# Altium footprint library Footprints.PcbLib: 158 footprints (part 4 of 10)
Each footprint in its own frame and in the unit in brackets; x right, y up, seen from the top. Pads: shape width x height; smd on the part's side, far side on the other; paste and mask are expansions set on the pad; w line width, h text height; cw(c..) or ccw(c..) is an arc to the next point about the centre after c.
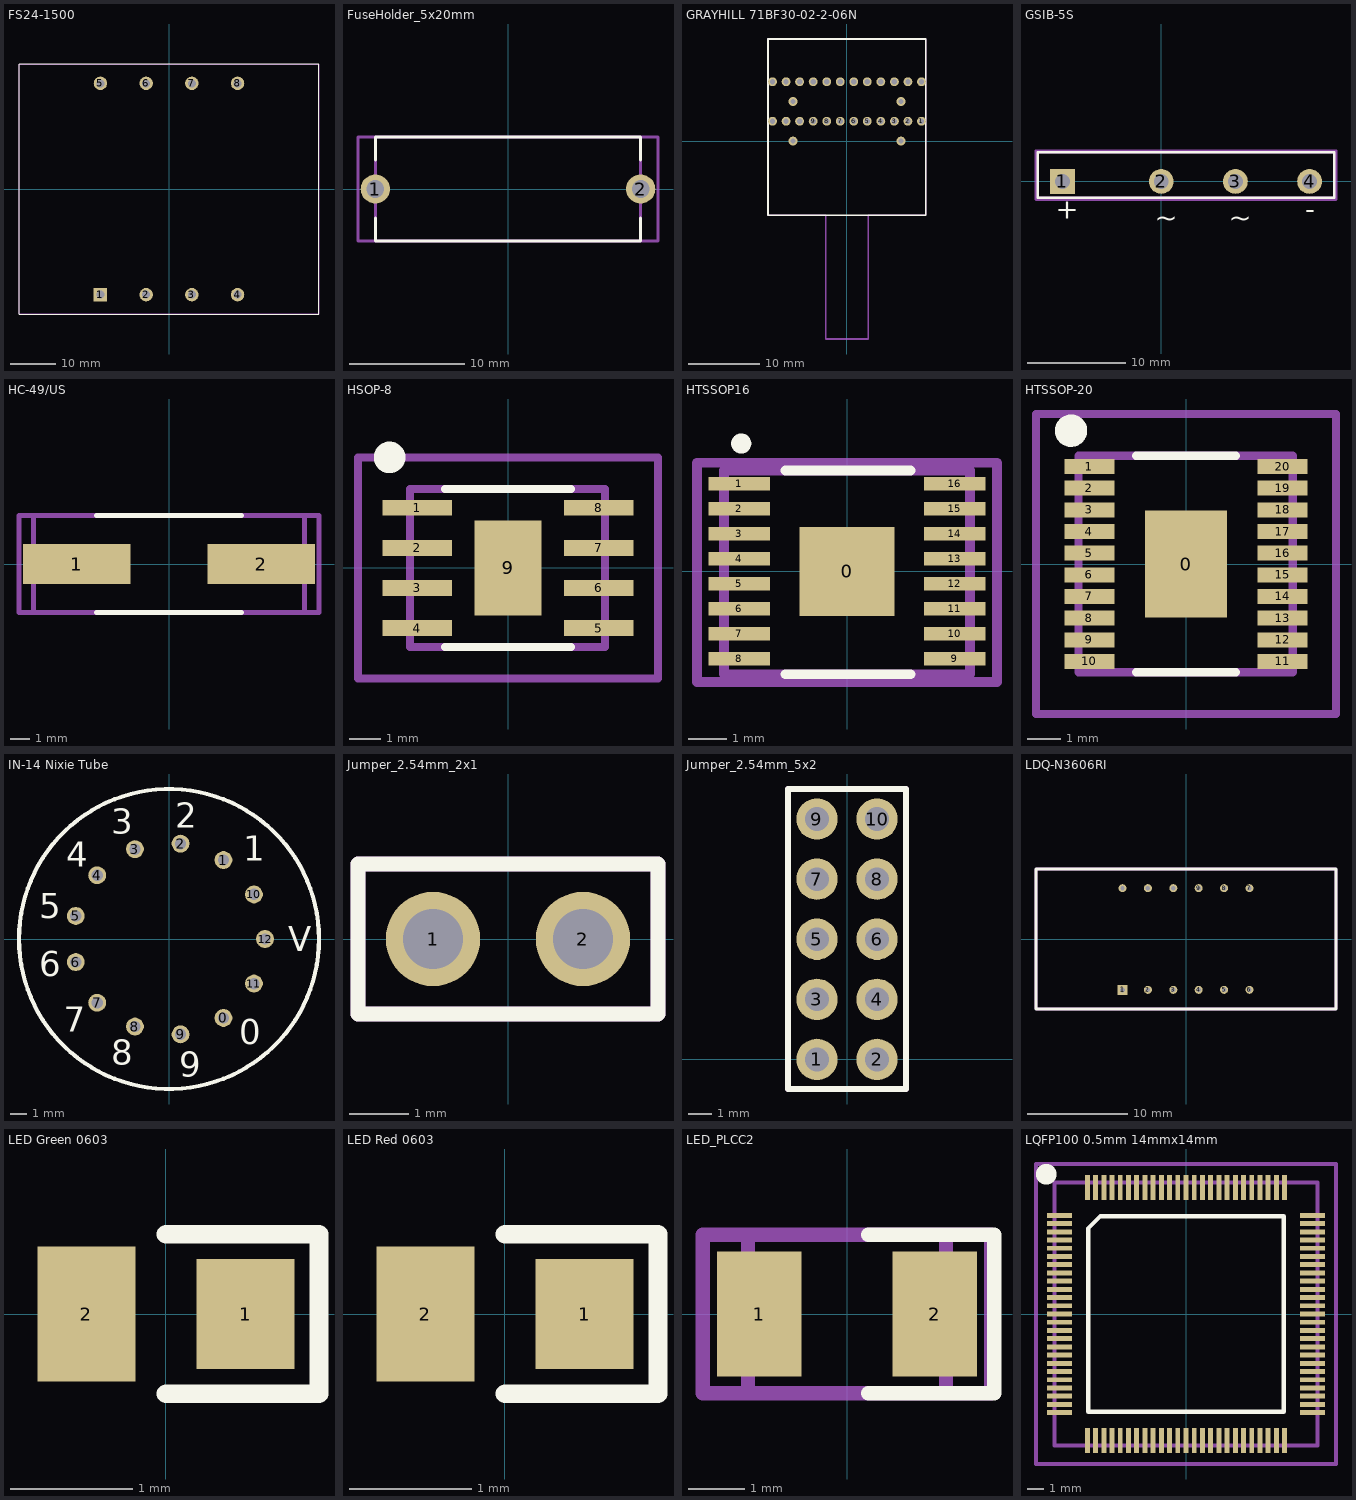
[diagram p3: the footprints below, top view; thin cyan lines are the x and y axes]

## FS24-1500 [mm] "115:115 - 24:24 xfrmr"
height 39.776
pads (8):
  rect 3x3 hole 1.8 mask+0.102: 1(-15.24,-23.5)
  round 3 hole 1.8 mask+0.102: 2(-5.08,-23.5) 3(5.08,-23.5) 4(15.24,-23.5) 5(-15.24,23.5) 6(-5.08,23.5) 7(5.08,23.5) 8(15.24,23.5)
Top Overlay:
  lines w0.254: -33.35,27.775 -33.35,-27.8 33.35,-27.8 33.35,27.8 -33.35,27.8
Mechanical 13:
  lines w0.254: -33.35,-27.788 -33.35,27.788 33.35,27.788 33.35,-27.788 -33.35,-27.788
3D body: height 39.67, standoff 0, extent -17.5,-23.5 17.5,23.5
3D body: height 25.4, standoff 12.7, extent -33.325,-27.825 33.325,27.8
3D body: height 2, standoff -4, extent -16.273,22.461 -14.198,24.539
3D body: height 2, standoff -4, extent -6.113,22.461 -4.038,24.539
3D body: height 2, standoff -4, extent 4.047,22.461 6.122,24.539
3D body: height 2, standoff -4, extent 14.207,22.461 16.282,24.539
3D body: height 2, standoff -4, extent -16.273,-24.539 -14.198,-22.461
3D body: height 2, standoff -4, extent -6.113,-24.539 -4.038,-22.461
3D body: height 2, standoff -4, extent 4.047,-24.539 6.122,-22.461
3D body: height 2, standoff -4, extent 14.207,-24.539 16.282,-22.461

## FuseHolder_5x20mm [mm]
height 12.7
pads (2):
  round 2.54 hole 1.524 mask+0.102: 1(-11.5,0) 2(11.5,0)
Top Overlay:
  lines w0.254: -11.5,-2.5 -11.5,-4.5 11.5,-4.5 11.5,-2.5 ; -11.5,2.5 -11.5,4.5 11.5,4.5 11.5,2.5
Mechanical 13:
  lines w0.254: -11.5,-4.5 11.5,-4.5 11.5,4.5 -11.5,4.5 -11.5,-4.5
Mechanical 15:
  lines w0.254: -13,-4.5 13,-4.5 13,4.5 -13,4.5 -13,-4.5
3D body: height 13.44, standoff -5.4, extent -11.64,-4.5 11.52,4.5

## GRAYHILL 71BF30-02-2-06N [mm] "Two deck, DP6T Rotary Switch"
height 16.5
pads (28):
  round 1.25 hole 0.75 mask+0.102: 1(10.51,2.79) 2(8.6,2.79) 3(6.69,2.79) 4(4.78,2.79) 5(2.87,2.79) 6(0.96,2.79) 7(-0.95,2.79) 8(-2.86,2.79) 9(-4.77,2.79) 10(-6.68,2.79) 11(-8.59,2.79) 12(-10.5,2.79) 13(10.51,8.37) 14(8.6,8.37) 15(6.69,8.37) 16(4.78,8.37) 17(2.87,8.37) 18(0.96,8.37) 19(-0.95,8.37) 20(-2.86,8.37) 21(-4.77,8.37) 22(-6.68,8.37) 23(-8.59,8.37) 24(-10.5,8.37) 25(7.625,0) 26(7.625,5.58) 27(-7.615,0) 28(-7.615,5.58)
Top Overlay:
  lines w0.254: -11.125,-10.475 3,-10.475 11.125,-10.475 11.125,14.4 -11.125,14.4 -11.125,-10.475
Mechanical 13:
  lines w0.254: -3.025,-10.475 -11.125,-10.475 -11.125,14.4 11.125,14.4 11.125,-10.475 3,-10.475 3,-27.925 -3,-27.925 -3,-10.475
Mechanical 15:
  lines w0.254: -11.125,-10.475 -3,-10.475 -3,-27.925 3,-27.925 3,-10.475 11.125,-10.475 11.125,14.4 -11.125,14.4 -11.125,-10.475
3D body: height 16.5, standoff 0, extent -11.125,-27.925 11.15,14.425

## GSIB-5S [mm] "Bridge Rectifier"
height 20
pads (4):
  rect 2.5x2.5 hole 1.5 mask+0.102: 1(-10,0)
  round 2.5 hole 1.5 mask+0.102: 2(0,0) 3(7.5,0) 4(15,0)
Top Overlay:
  lines w0.254: -12.5,-1.65 17.5,-1.65 17.5,2.95 -12.5,2.95 -12.5,-1.65
  text "+" at -10.675,-3.775 h2.03
  text "-" at 14.575,-3.775 h2.03
  text "~" at -0.675,-4.65 h2.03
  text "~" at 6.825,-4.65 h2.03
Mechanical 13:
  lines w0.254: -12.5,-1.65 -12.5,2.95 17.5,2.95 17.5,-1.65 -12.5,-1.65
Mechanical 15:
  lines w0.254: -12.675,-1.825 -12.675,3.125 17.675,3.125 17.675,-1.825 -12.675,-1.825
3D body: height 1, standoff -4, extent 7.004,-0.499 8,0.499
3D body: height 1, standoff -4, extent 14.504,-0.499 15.5,0.499
3D body: height 1, standoff -4, extent -0.496,-0.499 0.5,0.499
3D body: height 1, standoff -4, extent -10.496,-0.499 -9.5,0.499
3D body: height 20, standoff 1, extent -12.5,-1.65 17.5,2.95

## HC-49/US [mm] "Crystal"
height 4.5
pads (2):
  rect 5.55x2.05 smd mask+0.102: 1(-4.775,0) 2(4.775,0)
Top Overlay:
  lines w0.254: -3.75,-2.5 3.75,-2.5 ; -3.75,2.5 3.75,2.5
Mechanical 13:
  lines w0.254: -7,-2.5 -7,2.5 7,2.5 7,-2.5 -7,-2.5
Mechanical 15:
  lines w0.254: -7.75,-2.5 -7.75,2.5 7.75,2.5 7.75,-2.5 -7.75,-2.5
3D body: height 4.5, standoff -0.01, extent -6.95,-2.5 6.95,2.5

## HSOP-8 [mm]
height 1.7
pads (9):
  rect 2.2x0.5 smd: 1(-2.875,1.905) 2(-2.875,0.635) 3(-2.875,-0.635) 4(-2.875,-1.905) 5(2.875,-1.905) 6(2.875,-0.635) 7(2.875,0.635) 8(2.875,1.905)
  rect 2.13x3 smd paste-0.35: 9(0,0)
Top Overlay:
  circle w0.5: c-3.75,3.5 r0.25
  lines w0.254: -2,-2.5 2,-2.5 ; -2,2.5 2,2.5
Mechanical 13:
  lines w0.254: -3.1,-2.5 -3.1,2.5 3.075,2.5 3.075,-2.5 -3.1,-2.5
Mechanical 15:
  lines w0.254: -4.75,-3.5 4.75,-3.5 4.75,3.5 -4.75,3.5 -4.75,-3.5
3D body: height 2, standoff 0, extent -3.081,-2.5 3.082,2.5

## HTSSOP16 [mm] "0.65mm Pitch"
height 1.2
pads (17):
  rect 2.46x2.31 smd mask+0.102: 0(0,0)
  rect 1.6x0.35 smd mask+0.102: 1(-2.8,2.275) 2(-2.8,1.625) 3(-2.8,0.975) 4(-2.8,0.325) 5(-2.8,-0.325) 6(-2.8,-0.975) 7(-2.8,-1.625) 8(-2.8,-2.275) 9(2.8,-2.275) 10(2.8,-1.625) 11(2.8,-0.975) 12(2.8,-0.325) 13(2.8,0.325) 14(2.8,0.975) 15(2.8,1.625) 16(2.8,2.275)
Top Overlay:
  circle w0.254: c-2.75,3.325 r0.135
  lines w0.254: -1.6,-2.675 1.65,-2.675 ; -1.6,2.625 1.65,2.625
Mechanical 13:
  lines w0.254: -3.2,-2.675 3.2,-2.675 3.2,2.625 -3.2,2.625 -3.2,-2.675
Mechanical 15:
  lines w0.254: -3.9,-2.875 3.9,-2.875 3.9,2.825 -3.9,2.825 -3.9,-2.875
3D body: height 1.09, standoff 0, extent -3.058,-2.5 3.222,2.5

## HTSSOP-20 [mm]
height 1.2
pads (21):
  rect 2.45x3.2 smd: 0(0,0)
  rect 1.5x0.45 smd: 1(-2.9,2.925) 2(-2.9,2.275) 3(-2.9,1.625) 4(-2.9,0.975) 5(-2.9,0.325) 6(-2.9,-0.325) 7(-2.9,-0.975) 8(-2.9,-1.625) 9(-2.9,-2.275) 10(-2.9,-2.925) 11(2.9,-2.925) 12(2.9,-2.275) 13(2.9,-1.625) 14(2.9,-0.975) 15(2.9,-0.325) 16(2.9,0.325) 17(2.9,0.975) 18(2.9,1.625) 19(2.9,2.275) 20(2.9,2.925)
Top Overlay:
  circle w0.5: c-3.45,4 r0.237
  lines w0.254: -1.5,-3.25 1.5,-3.25 ; -1.5,3.25 1.5,3.25
Mechanical 13:
  lines w0.254: -3.225,-3.25 -3.225,3.25 3.2,3.25 3.2,-3.25 -3.225,-3.25
Mechanical 15:
  lines w0.254: -4.5,-4.5 4.5,-4.5 4.5,4.5 -4.5,4.5 -4.5,-4.5
3D body: height 0.95, standoff -0.06, extent -3.232,-3.25 3.182,3.25

## IN-14 Nixie Tube [mm]
pads (13):
  round 1.1 hole 0.7: 0(3.36,-4.87) 1(3.36,4.87) 2(0.71,5.88) 3(-2.1,5.54) 4(-4.43,3.93) 5(-5.75,1.42) 6(-5.75,-1.42) 7(-4.43,-3.93) 8(-2.1,-5.4) 9(0.71,-5.88) 10(5.24,2.75) 11(5.24,-2.75) 12(5.92,0)
Top Overlay:
  circle w0.254: c0,0 r9.25
  text "V" at 7.366,-0.762 h1.52
  text "0" at 4.318,-6.477 h1.52
  text "1" at 4.572,4.826 h1.52
  text "2" at 0.381,6.858 h1.52
  text "3" at -3.556,6.477 h1.52
  text "8" at -3.556,-7.747 h1.52
  text "6" at -8.001,-2.286 h1.52
  text "5" at -8.001,1.27 h1.52
  text "4" at -6.35,4.445 h1.52
  text "9" at 0.635,-8.509 h1.52
  text "7" at -6.477,-5.715 h1.52
3D body: height 2, standoff -3, extent 3.112,4.621 3.61,5.12
3D body: height 2, standoff -3, extent 0.462,5.631 0.96,6.13
3D body: height 2, standoff -3, extent -2.348,5.291 -1.85,5.79
3D body: height 2, standoff -3, extent -4.678,3.681 -4.18,4.18
3D body: height 2, standoff -3, extent -5.998,1.171 -5.5,1.67
3D body: height 2, standoff -3, extent -5.998,-1.669 -5.5,-1.17
3D body: height 2, standoff -3, extent -4.678,-4.179 -4.18,-3.68
3D body: height 2, standoff -3, extent -2.348,-5.649 -1.85,-5.15
3D body: height 2, standoff -3, extent 0.462,-6.129 0.96,-5.63
3D body: height 2, standoff -3, extent 3.112,-5.119 3.61,-4.62
3D body: height 2, standoff -3, extent 4.992,-2.999 5.49,-2.5
3D body: height 2, standoff -3, extent 5.672,-0.249 6.17,0.25
3D body: height 2, standoff -3, extent 4.992,2.501 5.49,3
3D body: height 40.5, standoff 2, extent -8.433,-8.483 8.5,8.483

## Jumper_2.54mm_2x1 [mm]
height 8.51
pads (2):
  round 1.6 hole 1.02 mask+0.102: 1(-1.27,0) 2(1.27,0)
Top Overlay:
  lines w0.254: -2.54,-1.27 2.54,-1.27 2.54,1.27 -2.54,1.27 -2.54,-1.27
Mechanical 13:
  lines w0.254: -2.54,-1.27 2.54,-1.27 2.54,1.27 -2.54,1.27 -2.54,-1.27
Mechanical 15:
  lines w0.254: -2.54,-1.27 2.54,-1.27 2.54,1.27 -2.54,1.27 -2.54,-1.27
3D body: height 18.66, standoff -3.7, extent -2.54,-1.27 2.54,1.27

## Jumper_2.54mm_5x2 [mm]
height 7.54
pads (10):
  round 1.75 hole 1 mask+0.102: 1(-1.27,0) 2(1.27,0) 3(-1.27,2.54) 4(1.27,2.54) 5(-1.27,5.08) 6(1.27,5.08) 7(-1.27,7.62) 8(1.27,7.62) 9(-1.27,10.16) 10(1.27,10.16)
Top Overlay:
  lines w0.254: -2.5,-1.25 2.5,-1.25 2.5,11.43 -2.5,11.43 -2.5,-1.25
Mechanical 13:
  lines w0.254: -2.5,-1.25 -2.5,11.43 2.5,11.43 2.5,-1.25 -2.5,-1.25
Mechanical 15:
  lines w0.254: -2.5,-1.25 -2.5,11.43 2.5,11.43 2.5,-1.25 -2.5,-1.25
3D body: height 7.54, standoff -3, extent -1.667,-0.399 -0.87,0.399
3D body: height 7.54, standoff -3, extent 0.873,-0.399 1.67,0.399
3D body: height 7.54, standoff -3, extent -1.667,2.141 -0.87,2.939
3D body: height 7.54, standoff -3, extent 0.873,2.141 1.67,2.939
3D body: height 7.54, standoff -3, extent -1.667,4.681 -0.87,5.479
3D body: height 7.54, standoff -3, extent 0.873,4.681 1.67,5.479
3D body: height 7.54, standoff -3, extent -1.667,7.221 -0.87,8.019
3D body: height 7.54, standoff -3, extent 0.873,7.221 1.67,8.019
3D body: height 7.54, standoff -3, extent -1.667,9.761 -0.87,10.559
3D body: height 7.54, standoff -3, extent 0.873,9.761 1.67,10.559
3D body: height 8.25, standoff -2.35, extent -2.54,-1.27 2.54,11.43

## LDQ-N3606RI [mm] "4 Digit - 7 Segment Display"
height 7.2
pads (12):
  rect 1x1 hole 0.5 mask+0.102: 1(-6.35,-5.08)
  round 0.8 hole 0.45 mask+0.102: 2(-3.81,-5.08) 3(-1.27,-5.08) 4(1.27,-5.08) 5(3.81,-5.08) 6(6.35,-5.08) 7(6.35,5.08) 8(3.81,5.08) 9(1.27,5.08) 10(-1.27,5.08) 11(-3.81,5.08) 12(-6.35,5.08)
Top Overlay:
  lines w0.254: -15,-7 15,-7 15,7 -15,7 -15,-7
Mechanical 13:
  lines w0.254: -15,-7 15,-7 15,7 -15,7 -15,-7
Mechanical 15:
  lines w0.254: -15,-7 15,-7 15,7 -1,7 -15,7 -15,-7
3D body: height 5.8, standoff -5.7, extent -16,-5.05 16,5.05

## LED Green 0603 [mm] "LED Green 0603"
height 0.3
pads (2):
  rect 0.8x0.9 smd: 1(0.65,0)
  rect 0.8x1.1 smd: 2(-0.65,0)
Top Overlay:
  lines w0.152: 0,-0.65 1.25,-0.65 1.25,0.65 0,0.65
3D body: height 0.3, standoff 0.01, extent -0.508,-0.381 0.508,0.381
3D body: height 0.2, standoff 0, extent -0.8,-0.4 0.8,0.4

## LED Red 0603 [mm] "LED Red 0603"
height 0.3
pads (2):
  rect 0.8x0.9 smd: 1(0.65,0)
  rect 0.8x1.1 smd: 2(-0.65,0)
Top Overlay:
  lines w0.152: 0,-0.65 1.25,-0.65 1.25,0.65 0,0.65
3D body: height 0.3, standoff 0.01, extent -0.508,-0.381 0.508,0.381
3D body: height 0.2, standoff 0, extent -0.8,-0.4 0.8,0.4

## LED_PLCC2 [mm] "3.2mm x 2.8mm Kingbright LED"
height 1.9
pads (2):
  rect 1.5x2.2 smd mask+0.102: 1(-1.55,0) 2(1.55,0)
Top Overlay:
  lines w0.254: 0.375,-1.4 2.6,-1.4 2.6,1.4 0.375,1.4
Mechanical 13:
  lines w0.254: -1.75,1.35 -1.75,-1.4 1.75,-1.4 1.75,1.4 -1.75,1.4
Mechanical 15:
  lines w0.254: -2.55,-1.4 2.55,-1.4 2.55,1.4 -2.55,1.4 -2.55,-1.4
3D body: height 1.7, standoff 0.05, extent -1.75,-1.35 1.75,1.45

## LQFP100 0.5mm 14mmx14mm [mm]
height 1.75
pads (100):
  rect 1.5x0.3 smd: 1(-7.7,6) 2(-7.7,5.5) 3(-7.7,5) 4(-7.7,4.5) 5(-7.7,4) 6(-7.7,3.5) 7(-7.7,3) 8(-7.7,2.5) 9(-7.7,2) 10(-7.7,1.5) 11(-7.7,1) 12(-7.7,0.5) 13(-7.7,0) 14(-7.7,-0.5) 15(-7.7,-1) 16(-7.7,-1.5) 17(-7.7,-2) 18(-7.7,-2.5) 19(-7.7,-3) 20(-7.7,-3.5) 21(-7.7,-4) 22(-7.7,-4.5) 23(-7.7,-5) 24(-7.7,-5.5) 25(-7.7,-6) 51(7.7,-6) 52(7.7,-5.5) 53(7.7,-5) 54(7.7,-4.5) 55(7.7,-4) 56(7.7,-3.5) 57(7.7,-3) 58(7.7,-2.5) 59(7.7,-2) 60(7.7,-1.5) 61(7.7,-1) 62(7.7,-0.5) 63(7.7,0) 64(7.7,0.5) 65(7.7,1) 66(7.7,1.5) 67(7.7,2) 68(7.7,2.5) 69(7.7,3) 70(7.7,3.5) 71(7.7,4) 72(7.7,4.5) 73(7.7,5) 74(7.7,5.5) 75(7.7,6)
  rect 0.3x1.5 smd: 26(-6,-7.7) 27(-5.5,-7.7) 28(-5,-7.7) 29(-4.5,-7.7) 30(-4,-7.7) 31(-3.5,-7.7) 32(-3,-7.7) 33(-2.5,-7.7) 34(-2,-7.7) 35(-1.5,-7.7) 36(-1,-7.7) 37(-0.5,-7.7) 38(0,-7.7) 39(0.5,-7.7) 40(1,-7.7) 41(1.5,-7.7) 42(2,-7.7) 43(2.5,-7.7) 44(3,-7.7) 45(3.5,-7.7) 46(4,-7.7) 47(4.5,-7.7) 48(5,-7.7) 49(5.5,-7.7) 50(6,-7.7) 76(6,7.7) 77(5.5,7.7) 78(5,7.7) 79(4.5,7.7) 80(4,7.7) 81(3.5,7.7) 82(3,7.7) 83(2.5,7.7) 84(2,7.7) 85(1.5,7.7) 86(1,7.7) 87(0.5,7.7) 88(0,7.7) 89(-0.5,7.7) 90(-1,7.7) 91(-1.5,7.7) 92(-2,7.7) 93(-2.5,7.7) 94(-3,7.7) 95(-3.5,7.7) 96(-4,7.7) 97(-4.5,7.7) 98(-5,7.7) 99(-5.5,7.7) 100(-6,7.7)
Top Overlay:
  circle w1: c-8.5,8.5 r0.125
  lines w0.254: -5.95,-5.95 5.95,-5.95 5.95,5.95 -5.2,5.95 -5.95,5.2 -5.95,-5.95
Mechanical 13:
  lines w0.254: -8,-8 -8,8 8,8 8,-8 -8,-8
Mechanical 15:
  lines w0.254: -9.125,-9.125 9.125,-9.125 9.125,9.125 -9.125,9.125 -9.125,-9.125
3D body: height 1.6, standoff 0, extent -8,-7.999 8,8.001